# Altium footprint library XU-GENARAL PCB .PcbLib: 1176 footprints (part 27 of 75)
Each footprint in its own frame and in the unit in brackets; x right, y up, seen from the top. Pads: shape width x height; smd on the part's side, far side on the other; paste and mask are expansions set on the pad; w line width, h text height; cw(c..) or ccw(c..) is an arc to the next point about the centre after c.
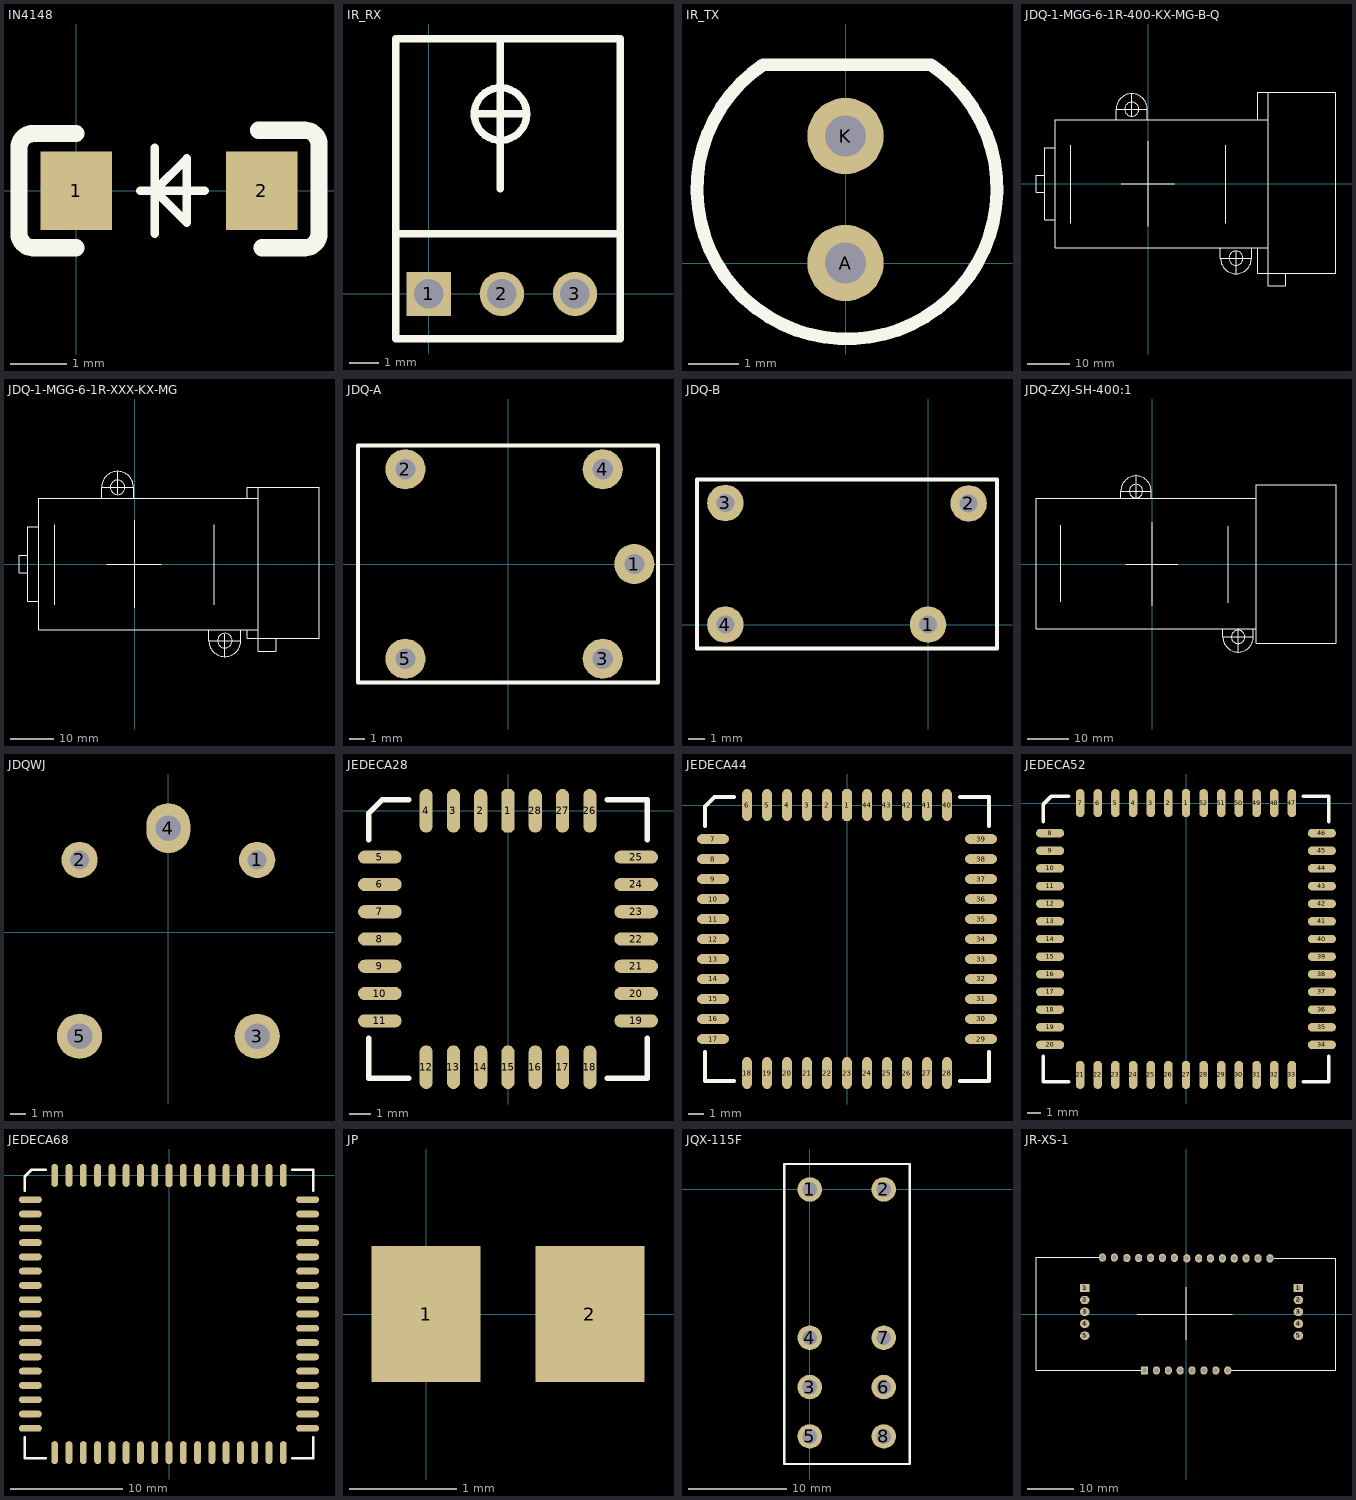
[diagram p26: the footprints below, top view; thin cyan lines are the x and y axes]

## IN4148 [mil]
pads (2):
  rect 50x55 smd: 1(0,0) 2(130,0)
Top Overlay:
  lines w6: 45,0 90,0 ; 55,-30 55,30 ; 55,0 77.5,-22.5 77.5,22.5 55,0
  lines w12: 0,-40 -30,-40 cw(c-30,-30) -40,-30 -40,30 cw(c-30,30) -30,40 0,40 ; 127.7,42.3 160,42.3 cw(c160,32.3) 170,32.3 170,-30 cw(c160,-30) 160,-40 130,-40

## IR_RX [mm]
pads (3):
  rect 1.5x1.5 hole 1: 1(0,0)
  round 1.5 hole 1: 2(2.476,0) 3(4.952,0)
Top Overlay:
  circle w0.254: c2.43,6.093 r0.889
  lines w0.254: -1.126,2.029 6.494,2.029 ; 1.575,6.096 3.277,6.096 ; 2.43,3.553 2.43,8.633 ; -1.126,-1.527 -1.126,8.633 6.494,8.633 6.494,-1.527 -1.126,-1.527

## IR_TX [mil]
pads (2):
  round 60 hole 32: A(0,0) K(0,100)
Top Overlay:
  lines w10: -64.87,156.19 ccw(c1.18,58.27) 67.23,156.19 -64.87,156.19

## JDQ-1-MGG-6-1R-400-KX-MG-B-Q [mil]
Top Overlay:
  circle w10: c811.02,-688.98 r64.96
  circle w10: c-153.54,688.98 r64.96
  lines w6: -716.53,-366.14 -716.53,354.33 ; 716.53,-366.14 716.53,354.33
  lines w10: -961.61,-78.74 -1039.37,-78.74 -1039.37,78.74 -960.63,78.74 ; -864.17,334.65 -960.63,334.65 -960.63,-334.65 -862.21,-334.65 ; -297.24,590.55 -297.24,688.98 ; -251.97,0 240.16,0 ; -153.54,629.92 -153.54,832.68 ; -9.84,590.55 -9.84,688.98 ; 0,-393.7 0,393.7 ; 667.32,-590.55 667.32,-688.98 ccw(c811.02,-688.98) 954.73,-688.98 ; 671.26,-688.98 954.72,-688.98 ; 811.02,-832.68 811.02,-629.92 ; 954.72,-590.55 954.72,-688.98 ; 1011.81,-590.55 1011.81,-826.77 1110.24,-826.77 ; 1011.81,590.55 1011.81,846.46 1110.24,846.46 ; 1110.24,-590.55 -862.21,-590.55 -862.21,590.55 1110.24,590.55 ; 1267.72,-826.77 1267.72,-944.88 1110.24,-944.88 1110.24,-826.77 ; 1732.28,-826.77 1110.24,-826.77 ; 1732.28,846.46 1110.24,846.46 ; 1736.22,-826.77 1736.22,846.46 ; -297.24,688.98 cw(c-153.54,688.98) -9.84,688.98 ; -297.24,688.98 -9.84,688.98 ; 1110.24,-826.77 1110.24,-629.92 1110.24,629.92 1110.24,846.46

## JDQ-1-MGG-6-1R-XXX-KX-MG [mil]
Top Overlay:
  circle w10: c811.02,-688.98 r64.96
  circle w10: c-153.54,688.98 r64.96
  lines w6: -716.53,-366.14 -716.53,354.33 ; 716.53,-366.14 716.53,354.33
  lines w10: -961.61,-78.74 -1039.37,-78.74 -1039.37,78.74 -960.63,78.74 ; -864.17,334.65 -960.63,334.65 -960.63,-334.65 -862.21,-334.65 ; -297.24,590.55 -297.24,688.98 ; -251.97,0 240.16,0 ; -153.54,629.92 -153.54,832.68 ; -9.84,590.55 -9.84,688.98 ; 0,-393.7 0,393.7 ; 667.32,-590.55 667.32,-688.98 ccw(c811.02,-688.98) 954.73,-688.98 ; 671.26,-688.98 954.72,-688.98 ; 811.02,-832.68 811.02,-629.92 ; 954.72,-590.55 954.72,-688.98 ; 1011.81,-590.55 1011.81,-669.29 1110.24,-669.29 ; 1011.81,590.55 1011.81,688.98 1110.24,688.98 ; 1110.24,-668.31 1110.24,-786.42 1267.72,-786.42 1267.72,-668.31 ; 1110.24,-590.55 -862.21,-590.55 -862.21,590.55 1110.24,590.55 ; -297.24,688.98 cw(c-153.54,688.98) -9.84,688.98 ; -297.24,688.98 -9.84,688.98 ; 1110.24,-669.29 1110.24,-629.92 1110.24,629.92 1110.24,688.98 ; 1110.24,-669.29 1657.48,-669.29 1657.48,688.98 1110.24,688.98

## JDQ-A [mm]
pads (5):
  round 2.54 hole 1.27: 1(8,0) 2(-6.5,6) 3(6,-6) 4(6,6) 5(-6.5,-6)
Top Overlay:
  lines w0.254: -9.5,-7.5 9.5,-7.5 9.5,7.5 -9.5,7.5 -9.5,-7.5

## JDQ-B [mil]
pads (4):
  round 90 hole 45: 1(0,0) 2(100,299) 3(-500,300) 4(-500,0)
Top Overlay:
  lines w10: -570,-59 170,-59 170,299 170,358 100,358 -500,358 -570,358 -570,-59

## JDQ-ZXJ-SH-400:1 [mil]
Top Overlay:
  circle w10: c-153.54,688.98 r62.99
  circle w10: c811.02,-688.98 r62.99
  lines w6: -862.21,-356.3 -862.21,364.17 ; 716.53,-366.14 716.53,354.33
  lines w10: -297.24,622.05 -297.24,688.98 ; -251.97,0 240.16,0 ; -153.54,629.92 -153.54,832.68 ; -9.84,622.05 -9.84,688.98 ; 0,-393.7 0,393.7 ; 667.32,-610.24 667.32,-688.98 ccw(c811.02,-688.98) 954.73,-688.98 ; 671.26,-688.98 954.72,-688.98 ; 811.02,-832.68 811.02,-629.92 ; 954.72,-610.24 954.72,-688.98 ; 984.25,-610.24 -1098.42,-610.24 -1098.42,622.05 984.25,622.05 ; 1732.28,-748.03 984.25,-748.03 984.25,748.03 1732.28,748.03 ; 1736.22,-748.03 1736.22,748.03 ; -297.24,688.98 cw(c-153.54,688.98) -9.84,688.98 ; -297.24,688.98 -9.84,688.98

## JDQWJ [mm]
pads (5):
  round 2.4 hole 1.26: 1(5.89,4.8) 2(-5.89,4.8)
  round 3 hole 1.7: 3(5.89,-6.9) 5(-5.89,-6.9)
  oval 2.921x3.302 hole 1.7: 4(0,6.9)
Bottom Overlay:
  lines w0.254: -8.074,9.441 -8.074,-10.4 8.156,-10.4 8.156,9.5 -8.074,9.5

## JEDECA28 [mil]
pads (28):
  oct 24x80 smd: 1(0,0)
  oval 24x80 smd: 2(-50,0) 3(-100,0) 4(-150,0) 12(-150,-470) 13(-100,-470) 14(-50,-470) 15(0,-470) 16(50,-470) 17(100,-470) 18(150,-470) 26(150,0) 27(100,0) 28(50,0)
  oval 80x24 smd: 5(-235,-85) 6(-235,-135) 7(-235,-185) 8(-235,-235) 9(-235,-285) 10(-235,-335) 11(-235,-385) 19(235,-385) 20(235,-335) 21(235,-285) 22(235,-235) 23(235,-185) 24(235,-135) 25(235,-85)
Top Overlay:
  lines w10: -255,-417 -255,-490 -182,-490 ; -255,-53 -255,-4 -231,20 -182,20 ; 182,-490 255,-490 255,-417 ; 182,20 255,20 255,-53

## JEDECA44 [mil]
pads (44):
  oct 24x80 smd: 1(0,0)
  oval 24x80 smd: 2(-50,0) 3(-100,0) 4(-150,0) 5(-200,0) 6(-250,0) 18(-250,-670) 19(-200,-670) 20(-150,-670) 21(-100,-670) 22(-50,-670) 23(0,-670) 24(50,-670) 25(100,-670) 26(150,-670) 27(200,-670) 28(250,-670) 40(250,0) 41(200,0) 42(150,0) 43(100,0) 44(50,0)
  oval 80x24 smd: 7(-335,-85) 8(-335,-135) 9(-335,-185) 10(-335,-235) 11(-335,-285) 12(-335,-335) 13(-335,-385) 14(-335,-435) 15(-335,-485) 16(-335,-535) 17(-335,-585) 29(335,-585) 30(335,-535) 31(335,-485) 32(335,-435) 33(335,-385) 34(335,-335) 35(335,-285) 36(335,-235) 37(335,-185) 38(335,-135) 39(335,-85)
Top Overlay:
  lines w10: -355,-617 -355,-690 -282,-690 ; -355,-53 -355,-4 -331,20 -282,20 ; 282,-690 355,-690 355,-617 ; 282,20 355,20 355,-53

## JEDECA52 [mil]
pads (52):
  oct 24x80 smd: 1(0,0)
  oval 24x80 smd: 2(-50,0) 3(-100,0) 4(-150,0) 5(-200,0) 6(-250,0) 7(-300,0) 21(-300,-770) 22(-250,-770) 23(-200,-770) 24(-150,-770) 25(-100,-770) 26(-50,-770) 27(0,-770) 28(50,-770) 29(100,-770) 30(150,-770) 31(200,-770) 32(250,-770) 33(300,-770) 47(300,0) 48(250,0) 49(200,0) 50(150,0) 51(100,0) 52(50,0)
  oval 80x24 smd: 8(-385,-85) 9(-385,-135) 10(-385,-185) 11(-385,-235) 12(-385,-285) 13(-385,-335) 14(-385,-385) 15(-385,-435) 16(-385,-485) 17(-385,-535) 18(-385,-585) 19(-385,-635) 20(-385,-685) 34(385,-685) 35(385,-635) 36(385,-585) 37(385,-535) 38(385,-485) 39(385,-435) 40(385,-385) 41(385,-335) 42(385,-285) 43(385,-235) 44(385,-185) 45(385,-135) 46(385,-85)
Top Overlay:
  lines w10: -405,-717 -405,-790 -332,-790 ; -405,-53 -405,-4 -381,20 -332,20 ; 332,-790 405,-790 405,-717 ; 332,20 405,20 405,-53

## JEDECA68 [mil]
pads (68):
  oct 24x80 smd: 1(0,0)
  oval 24x80 smd: 2(-50,0) 3(-100,0) 4(-150,0) 5(-200,0) 6(-250,0) 7(-300,0) 8(-350,0) 9(-400,0) 27(-400,-970) 28(-350,-970) 29(-300,-970) 30(-250,-970) 31(-200,-970) 32(-150,-970) 33(-100,-970) 34(-50,-970) 35(0,-970) 36(50,-970) 37(100,-970) 38(150,-970) 39(200,-970) 40(250,-970) 41(300,-970) 42(350,-970) 43(400,-970) 61(400,0) 62(350,0) 63(300,0) 64(250,0) 65(200,0) 66(150,0) 67(100,0) 68(50,0)
  oval 80x24 smd: 10(-485,-85) 11(-485,-135) 12(-485,-185) 13(-485,-235) 14(-485,-285) 15(-485,-335) 16(-485,-385) 17(-485,-435) 18(-485,-485) 19(-485,-535) 20(-485,-585) 21(-485,-635) 22(-485,-685) 23(-485,-735) 24(-485,-785) 25(-485,-835) 26(-485,-885) 44(485,-885) 45(485,-835) 46(485,-785) 47(485,-735) 48(485,-685) 49(485,-635) 50(485,-585) 51(485,-535) 52(485,-485) 53(485,-435) 54(485,-385) 55(485,-335) 56(485,-285) 57(485,-235) 58(485,-185) 59(485,-135) 60(485,-85)
Top Overlay:
  lines w10: -505,-917 -505,-990 -432,-990 ; -505,-53 -505,-4 -481,20 -432,20 ; 432,-990 505,-990 505,-917 ; 432,20 505,20 505,-53

## JP [mil]
pads (2):
  rect 40x50 smd: 1(0,0) 2(60,0)

## JQX-115F [mm]
pads (8):
  round 2.5 hole 1.5: 1(0,0) 2(7.56,0) 3(0,-20.16) 4(0,-15.12) 5(0,-25.2) 6(7.56,-20.16) 7(7.56,-15.12) 8(7.56,-25.2)
Top Overlay:
  lines w0.254: -2.6,-28 -2.6,2.6 10.2,2.6 ; -2.589,-28.016 10.211,-28.016 10.211,2.584

## JR-XS-1 [mil]
pads (33):
  rect 80x70 hole 40: 1(-853,220) 1(945,220)
  rect 59.05x70 hole 40: 1(-350,-473)
  oval 80x70 hole 40: 2(-853,120) 2(945,120) 3(-853,20) 3(945,20) 4(-853,-80) 4(945,-80) 5(-853,-180) 5(945,-180)
  oval 59.05x70 hole 40: 2(-250,-473) 3(-150,-473) 4(-50,-473) 5(50,-473) 6(150,-473) 7(250,-473) 8(350,-473) 9(704.82,470.28) 10(604.82,470.28) 11(504.82,470.28) 12(404.82,470.28) 13(304.82,470.28) 14(204.82,470.28) 15(105.64,470.57) 16(5.64,470.57) 17(-99.18,474.28) 18(-199.18,474.28) 19(-299.18,474.28) 20(-399.18,473.29) 21(-499.18,473.29) 22(-604,477) 23(-704,477)
Top Overlay:
  lines w10: -737.18,480.28 -1263.06,480.28 -1263.18,480.16 -1263.18,470.28 -1263.18,-471.72 -1261.9,-473 -350,-473 ; -410,0.64 390,0.64 ; 0,-213 0,227 ; 350,-473 1259.54,-473 1260.82,-471.72 1260.82,472.28 736.82,472.28
Bottom Overlay:
  lines w10: -903,170 -803,170 ; 895,170 995,170 ; -903,-230 -903,270 -803,270 -803,-230 -903,-230 ; 895,-230 895,270 995,270 995,-230 895,-230